# Altium integrated library WR-FPC_rev19a.IntLib: 242 symbols (part 2 of 2)
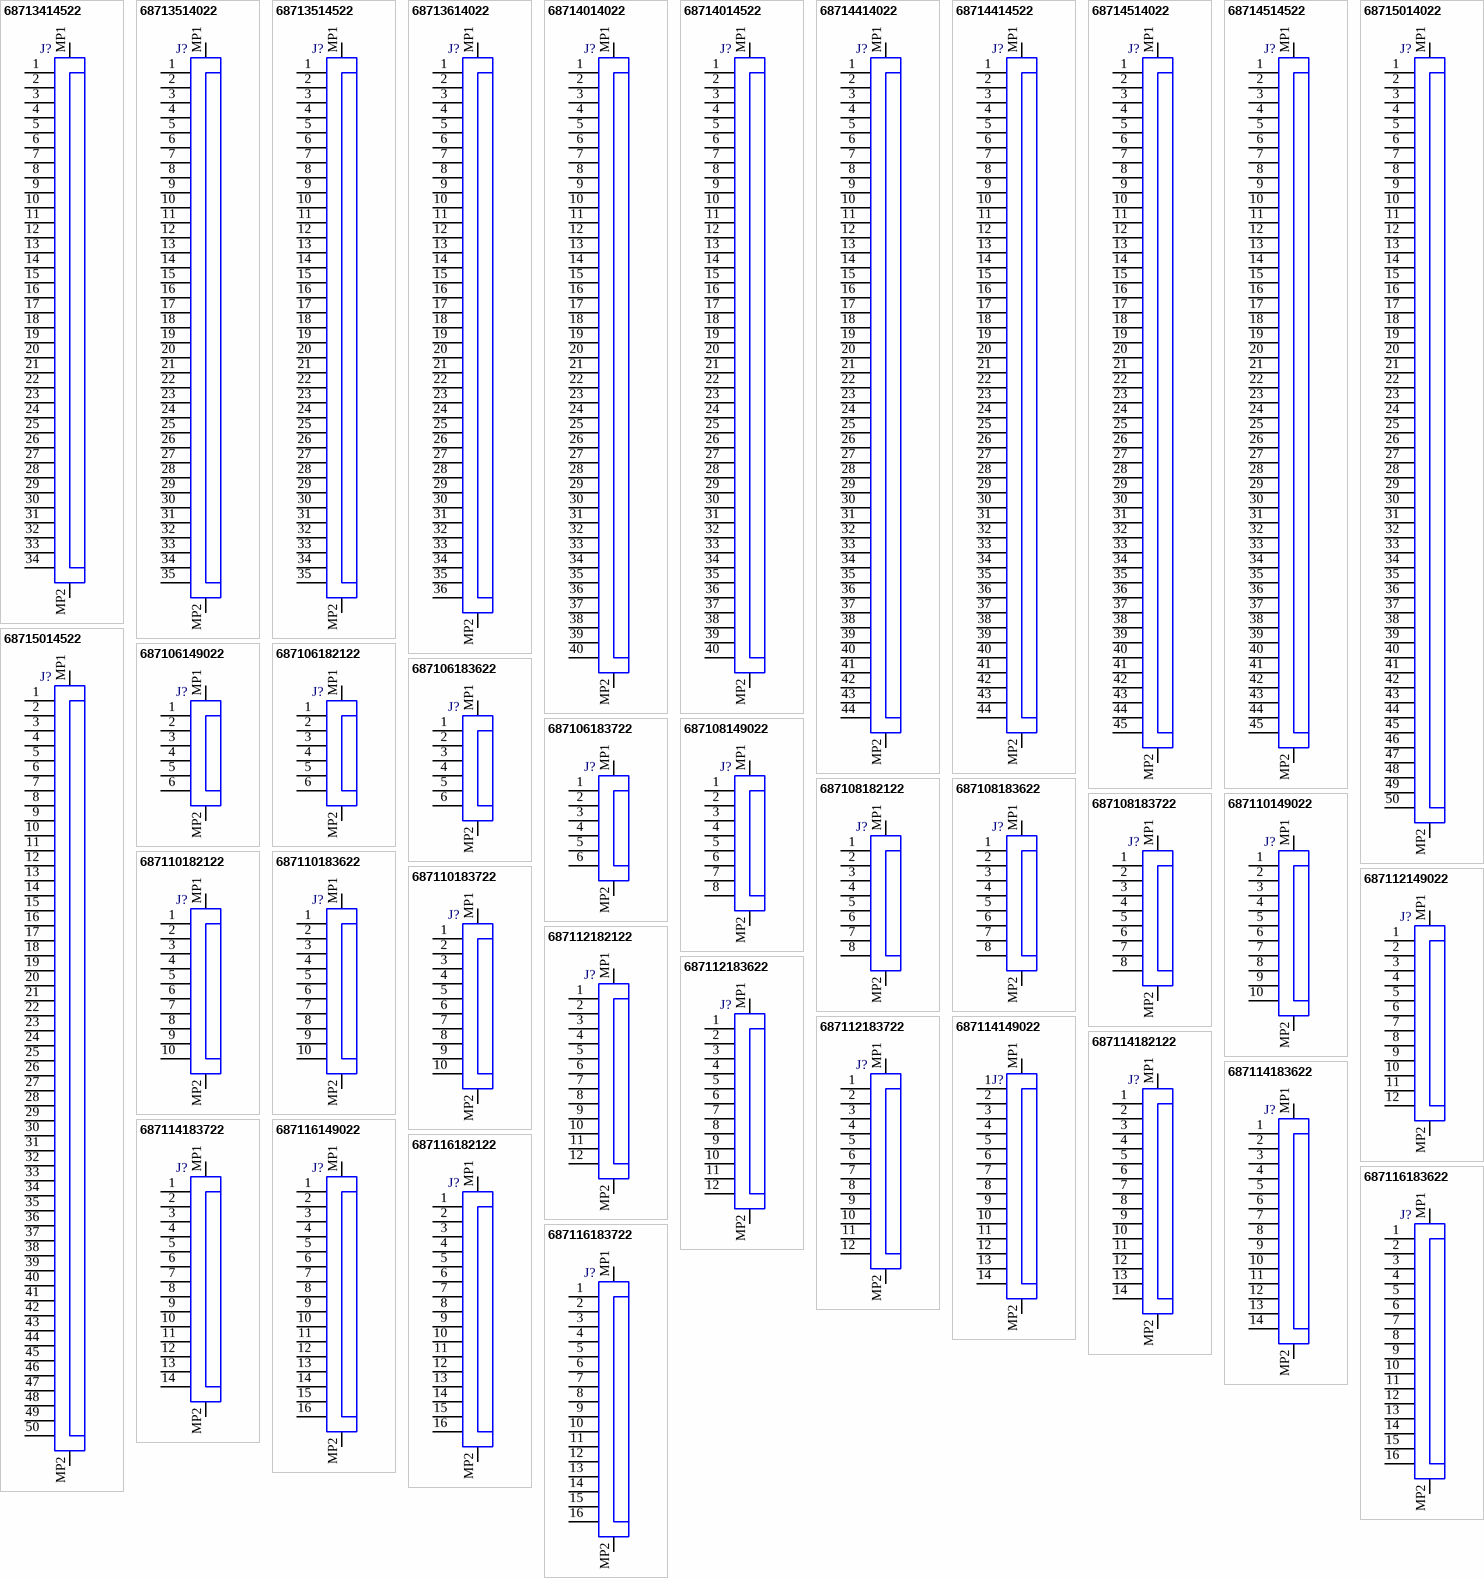
[diagram p8: symbols 68713414522 to 687116183722]

## 687112183622
designator J?
WR-FPC SMT ZIF Horizontal Top Contact Low Profile, pitch 0.5mm, 12p; Part Number: 687112183622; Contact Resistance: 30mOhm; Pin Number: 12; Working Voltage: 50VAC; Rated Current: 0.4A; ComponentLink1Description: Manufacturer; ComponentLink1URL: http://www.we-online.de; ComponentLink2Description: Datasheet; ComponentLink2URL: https://katalog.we-online.com/em/datasheet/687112183622.pdf; Packaging: Tape and Reel; Pitch: 0.5mm; Published Date: November 2019; Mounting Technology: SMT; Operating Temperature: -25 to +85degC; Length: 11.7mm; Type: Horizontal; Publisher: Wurth Elektronik
footprint 687112183622
pins: 1, 2, 3, 4, 5, 6, 7, 8, 9, 10, 11, 12, MP1, MP2

## 687112183722
designator J?
WR-FPC SMT ZIF Horizontal Bottom Contact Low Profile, pitch 0.5mm, 12p; Part Number: 687112183722; Contact Resistance: 30mOhm; Pin Number: 12; Working Voltage: 50VAC; Rated Current: 0.4A; ComponentLink1Description: Manufacturer; ComponentLink1URL: http://www.we-online.de; ComponentLink2Description: Datasheet; ComponentLink2URL: https://katalog.we-online.com/em/datasheet/687112183722.pdf; Packaging: Tape and Reel; Pitch: 0.5mm; Published Date: November 2019; Mounting Technology: SMT; Operating Temperature: -25 to +85degC; Length: 11.7mm; Type: Horizontal; Publisher: Wurth Elektronik
footprint 687112183722
pins: 1, 2, 3, 4, 5, 6, 7, 8, 9, 10, 11, 12, MP1, MP2

## 687114149022
designator J?
WR-FPC SMT ZIF Horizontal Bottom Contact, pitch 0.5mm, 14p; Part Number: 687114149022; Contact Resistance: 50mOhm; Pin Number: 14; Working Voltage: 50VAC; Rated Current: 0.5A; ComponentLink1Description: Manufacturer; ComponentLink1URL: http://www.we-online.de; ComponentLink2Description: Datasheet; ComponentLink2URL: https://katalog.we-online.com/em/datasheet/687114149022.pdf; Packaging: Tape and Reel; Pitch: 0.5mm; Published Date: November 2019; Mounting Technology: SMT; Operating Temperature: -25 to +85degC; Length: 11.1mm; Type: Horizontal; Publisher: Wurth Elektronik
footprint 687114149022
pins: 1, 2, 3, 4, 5, 6, 7, 8, 9, 10, 11, 12, 13, 14, MP1, MP2

## 687114182122
designator J?
WR-FPC SMT ZIF Horizontal Dual Contact, pitch 0.5mm, 14p; Part Number: 687114182122; Contact Resistance: 30mOhm; Pin Number: 14; Working Voltage: 50VAC; Rated Current: 0.5A; ComponentLink1Description: Manufacturer; ComponentLink1URL: http://www.we-online.de; ComponentLink2Description: Datasheet; ComponentLink2URL: https://katalog.we-online.com/em/datasheet/687114182122.pdf; Packaging: Tape and Reel; Pitch: 0.5mm; Published Date: November 2019; Mounting Technology: SMT; Operating Temperature: -25 to +85degC; Length: 9mm; Type: Horizontal; Publisher: Wurth Elektronik
footprint 687114182122
pins: 1, 2, 3, 4, 5, 6, 7, 8, 9, 10, 11, 12, 13, 14, MP1, MP2

## 687114183622
designator J?
WR-FPC SMT ZIF Horizontal Top Contact Low Profile, pitch 0.5mm, 14p; Part Number: 687114183622; Contact Resistance: 30mOhm; Pin Number: 14; Working Voltage: 50VAC; Rated Current: 0.4A; ComponentLink1Description: Manufacturer; ComponentLink1URL: http://www.we-online.de; ComponentLink2Description: Datasheet; ComponentLink2URL: https://katalog.we-online.com/em/datasheet/687114183622.pdf; Packaging: Tape and Reel; Pitch: 0.5mm; Published Date: November 2019; Mounting Technology: SMT; Operating Temperature: -25 to +85degC; Length: 12.7mm; Type: Horizontal; Publisher: Wurth Elektronik
footprint 687114183622
pins: 1, 2, 3, 4, 5, 6, 7, 8, 9, 10, 11, 12, 13, 14, MP1, MP2

## 687114183722
designator J?
WR-FPC SMT ZIF Horizontal Bottom Contact Low Profile, pitch 0.5mm, 14p; Part Number: 687114183722; Contact Resistance: 30mOhm; Pin Number: 14; Working Voltage: 50VAC; Rated Current: 0.4A; ComponentLink1Description: Manufacturer; ComponentLink1URL: http://www.we-online.de; ComponentLink2Description: Datasheet; ComponentLink2URL: https://katalog.we-online.com/em/datasheet/687114183722.pdf; Packaging: Tape and Reel; Pitch: 0.5mm; Published Date: November 2019; Mounting Technology: SMT; Operating Temperature: -25 to +85degC; Length: 12.7mm; Type: Horizontal; Publisher: Wurth Elektronik
footprint 687114183722
pins: 1, 2, 3, 4, 5, 6, 7, 8, 9, 10, 11, 12, 13, 14, MP1, MP2

## 687116149022
designator J?
WR-FPC SMT ZIF Horizontal Bottom Contact, pitch 0.5mm, 16p; Part Number: 687116149022; Contact Resistance: 50mOhm; Pin Number: 16; Working Voltage: 50VAC; Rated Current: 0.5A; ComponentLink1Description: Manufacturer; ComponentLink1URL: http://www.we-online.de; ComponentLink2Description: Datasheet; ComponentLink2URL: https://katalog.we-online.com/em/datasheet/687116149022.pdf; Packaging: Tape and Reel; Pitch: 0.5mm; Published Date: November 2019; Mounting Technology: SMT; Operating Temperature: -25 to +85degC; Length: 12.1mm; Type: Horizontal; Publisher: Wurth Elektronik
footprint 687116149022
pins: 1, 2, 3, 4, 5, 6, 7, 8, 9, 10, 11, 12, 13, 14, 15, 16, MP1, MP2

## 687116182122
designator J?
WR-FPC SMT ZIF Horizontal Dual Contact, pitch 0.5mm, 16p; Part Number: 687116182122; Contact Resistance: 30mOhm; Pin Number: 16; Working Voltage: 50VAC; Rated Current: 0.5A; ComponentLink1Description: Manufacturer; ComponentLink1URL: http://www.we-online.de; ComponentLink2Description: Datasheet; ComponentLink2URL: https://katalog.we-online.com/em/datasheet/687116182122.pdf; Packaging: Tape and Reel; Pitch: 0.5mm; Published Date: November 2019; Mounting Technology: SMT; Operating Temperature: -25 to +85degC; Length: 10mm; Type: Horizontal; Publisher: Wurth Elektronik
footprint 687116182122
pins: 1, 2, 3, 4, 5, 6, 7, 8, 9, 10, 11, 12, 13, 14, 15, 16, MP1, MP2

## 687116183622
designator J?
WR-FPC SMT ZIF Horizontal Top Contact Low Profile, pitch 0.5mm, 16p; Part Number: 687116183622; Contact Resistance: 30mOhm; Pin Number: 16; Working Voltage: 50VAC; Rated Current: 0.4A; ComponentLink1Description: Manufacturer; ComponentLink1URL: http://www.we-online.de; ComponentLink2Description: Datasheet; ComponentLink2URL: https://katalog.we-online.com/em/datasheet/687116183622.pdf; Packaging: Tape and Reel; Pitch: 0.5mm; Published Date: November 2019; Mounting Technology: SMT; Operating Temperature: -25 to +85degC; Length: 13.7mm; Type: Horizontal; Publisher: Wurth Elektronik
footprint 687116183622
pins: 1, 2, 3, 4, 5, 6, 7, 8, 9, 10, 11, 12, 13, 14, 15, 16, MP1, MP2

## 687116183722
designator J?
WR-FPC SMT ZIF Horizontal Bottom Contact Low Profile, pitch 0.5mm, 16p; Part Number: 687116183722; Contact Resistance: 30mOhm; Pin Number: 16; Working Voltage: 50VAC; Rated Current: 0.4A; ComponentLink1Description: Manufacturer; ComponentLink1URL: http://www.we-online.de; ComponentLink2Description: Datasheet; ComponentLink2URL: https://katalog.we-online.com/em/datasheet/687116183722.pdf; Packaging: Tape and Reel; Pitch: 0.5mm; Published Date: November 2019; Mounting Technology: SMT; Operating Temperature: -25 to +85degC; Length: 13.7mm; Type: Horizontal; Publisher: Wurth Elektronik
footprint 687116183722
pins: 1, 2, 3, 4, 5, 6, 7, 8, 9, 10, 11, 12, 13, 14, 15, 16, MP1, MP2

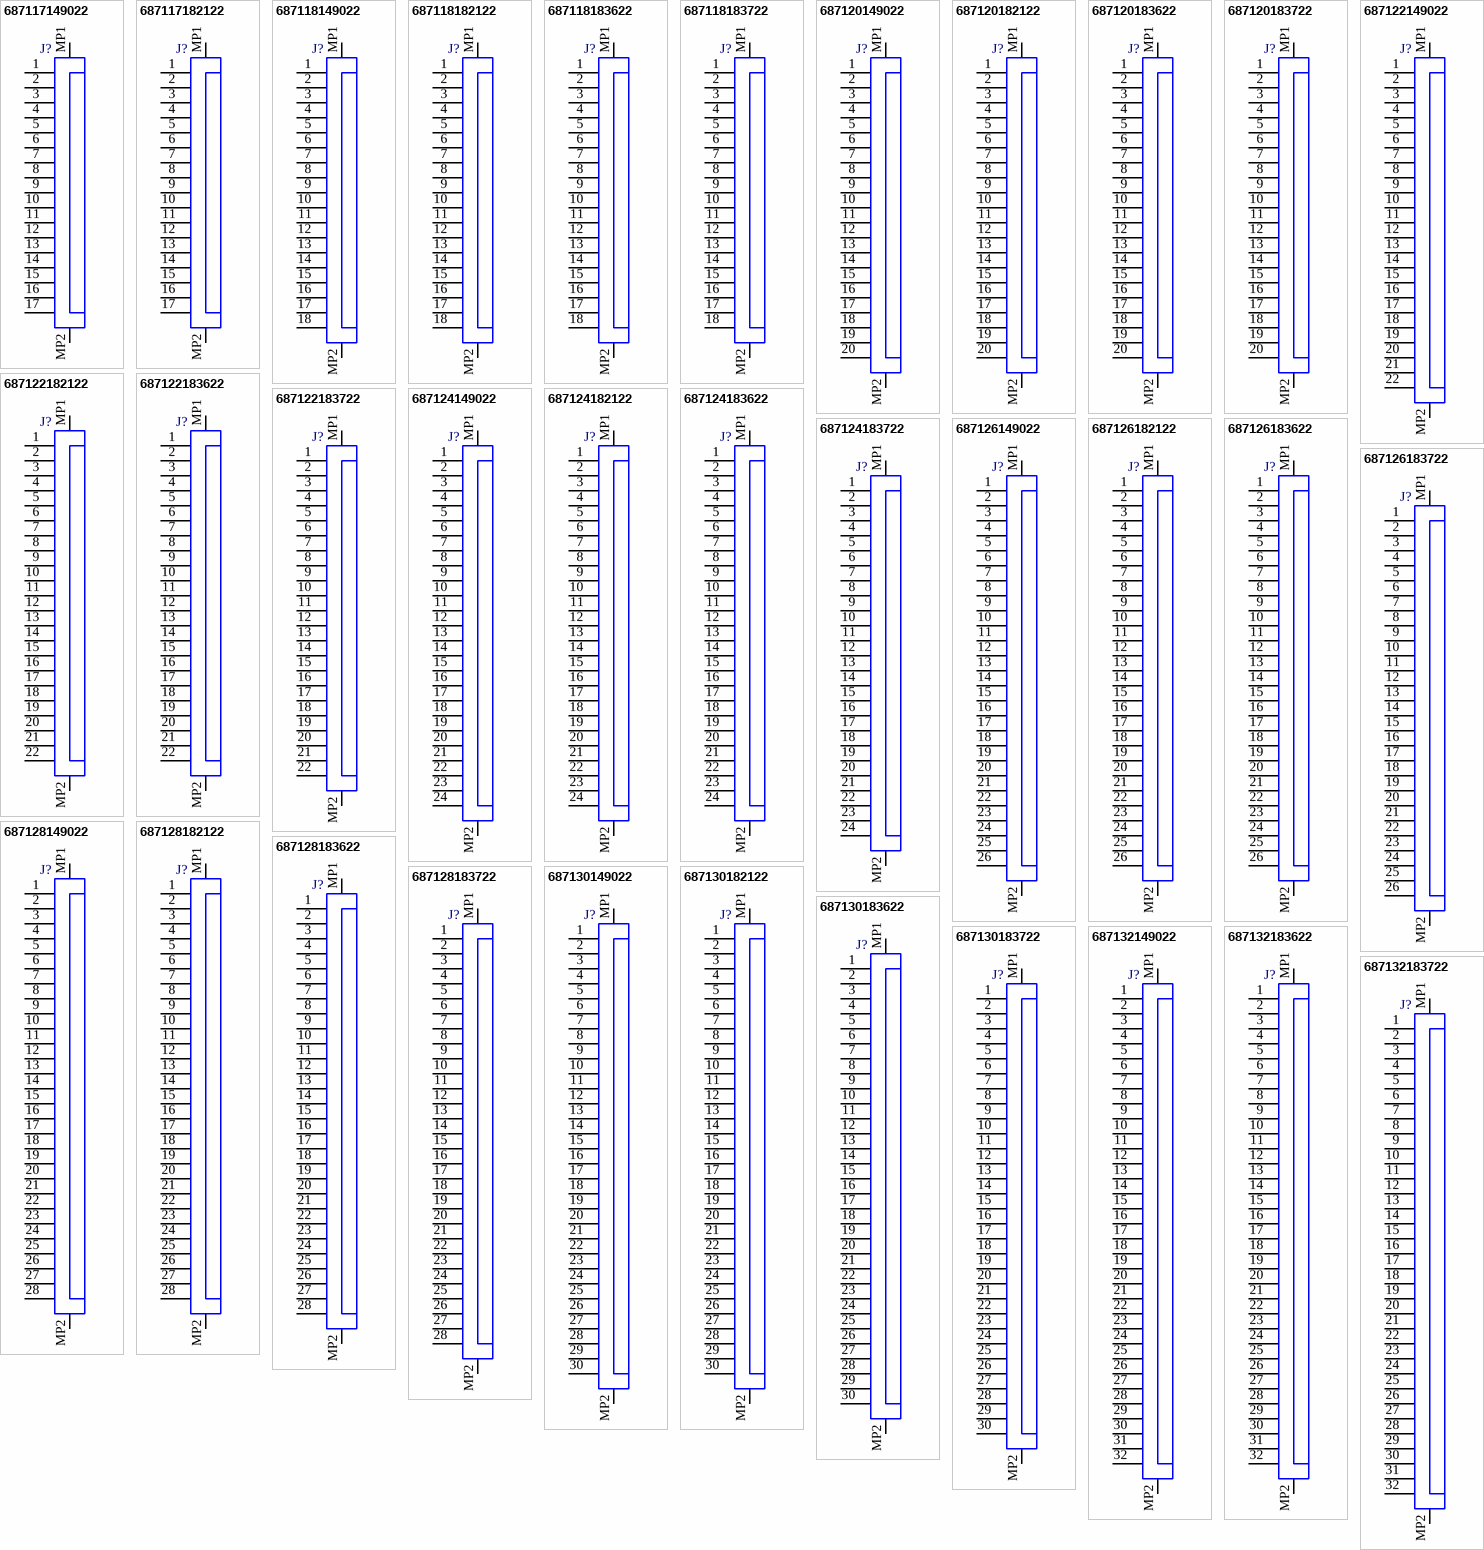
[diagram p5: symbols 687117149022 to 687132183722]

## 687117149022
designator J?
WR-FPC SMT ZIF Horizontal Bottom Contact, pitch 0.5mm, 17p; Part Number: 687117149022; Contact Resistance: 50mOhm; Pin Number: 17; Working Voltage: 50VAC; Rated Current: 0.5A; ComponentLink1Description: Manufacturer; ComponentLink1URL: http://www.we-online.de; ComponentLink2Description: Datasheet; ComponentLink2URL: https://katalog.we-online.com/em/datasheet/687117149022.pdf; Packaging: Tape and Reel; Pitch: 0.5mm; Published Date: November 2019; Mounting Technology: SMT; Operating Temperature: -25 to +85degC; Length: 12.6mm; Type: Horizontal; Publisher: Wurth Elektronik
footprint 687117149022
pins: 1, 2, 3, 4, 5, 6, 7, 8, 9, 10, 11, 12, 13, 14, 15, 16, 17, MP1, MP2

## 687117182122
designator J?
WR-FPC SMT ZIF Horizontal Dual Contact, pitch 0.5mm, 17p; Part Number: 687117182122; Contact Resistance: 30mOhm; Pin Number: 17; Working Voltage: 50VAC; Rated Current: 0.5A; ComponentLink1Description: Manufacturer; ComponentLink1URL: http://www.we-online.de; ComponentLink2Description: Datasheet; ComponentLink2URL: https://katalog.we-online.com/em/datasheet/687117182122.pdf; Packaging: Tape and Reel; Pitch: 0.5mm; Published Date: November 2019; Mounting Technology: SMT; Operating Temperature: -25 to +85degC; Length: 10.5mm; Type: Horizontal; Publisher: Wurth Elektronik
footprint 687117182122
pins: 1, 2, 3, 4, 5, 6, 7, 8, 9, 10, 11, 12, 13, 14, 15, 16, 17, MP1, MP2

## 687118149022
designator J?
WR-FPC SMT ZIF Horizontal Bottom Contact, pitch 0.5mm, 18p; Part Number: 687118149022; Contact Resistance: 50mOhm; Pin Number: 18; Working Voltage: 50VAC; Rated Current: 0.5A; ComponentLink1Description: Manufacturer; ComponentLink1URL: http://www.we-online.de; ComponentLink2Description: Datasheet; ComponentLink2URL: https://katalog.we-online.com/em/datasheet/687118149022.pdf; Packaging: Tape and Reel; Pitch: 0.5mm; Published Date: November 2019; Mounting Technology: SMT; Operating Temperature: -25 to +85degC; Length: 13.1mm; Type: Horizontal; Publisher: Wurth Elektronik
footprint 687118149022
pins: 1, 2, 3, 4, 5, 6, 7, 8, 9, 10, 11, 12, 13, 14, 15, 16, 17, 18, MP1, MP2

## 687118182122
designator J?
WR-FPC SMT ZIF Horizontal Dual Contact, pitch 0.5mm, 18p; Part Number: 687118182122; Contact Resistance: 30mOhm; Pin Number: 18; Working Voltage: 50VAC; Rated Current: 0.5A; ComponentLink1Description: Manufacturer; ComponentLink1URL: http://www.we-online.de; ComponentLink2Description: Datasheet; ComponentLink2URL: https://katalog.we-online.com/em/datasheet/687118182122.pdf; Packaging: Tape and Reel; Pitch: 0.5mm; Published Date: November 2019; Mounting Technology: SMT; Operating Temperature: -25 to +85degC; Length: 11mm; Type: Horizontal; Publisher: Wurth Elektronik
footprint 687118182122
pins: 1, 2, 3, 4, 5, 6, 7, 8, 9, 10, 11, 12, 13, 14, 15, 16, 17, 18, MP1, MP2

## 687118183622
designator J?
WR-FPC SMT ZIF Horizontal Top Contact Low Profile, pitch 0.5mm, 18p; Part Number: 687118183622; Contact Resistance: 30mOhm; Pin Number: 18; Working Voltage: 50VAC; Rated Current: 0.4A; ComponentLink1Description: Manufacturer; ComponentLink1URL: http://www.we-online.de; ComponentLink2Description: Datasheet; ComponentLink2URL: https://katalog.we-online.com/em/datasheet/687118183622.pdf; Packaging: Tape and Reel; Pitch: 0.5mm; Published Date: November 2019; Mounting Technology: SMT; Operating Temperature: -25 to +85degC; Length: 14.7mm; Type: Horizontal; Publisher: Wurth Elektronik
footprint 687118183622
pins: 1, 2, 3, 4, 5, 6, 7, 8, 9, 10, 11, 12, 13, 14, 15, 16, 17, 18, MP1, MP2

## 687118183722
designator J?
WR-FPC SMT ZIF Horizontal Bottom Contact Low Profile, pitch 0.5mm, 18p; Part Number: 687118183722; Contact Resistance: 30mOhm; Pin Number: 18; Working Voltage: 50VAC; Rated Current: 0.4A; ComponentLink1Description: Manufacturer; ComponentLink1URL: http://www.we-online.de; ComponentLink2Description: Datasheet; ComponentLink2URL: https://katalog.we-online.com/em/datasheet/687118183722.pdf; Packaging: Tape and Reel; Pitch: 0.5mm; Published Date: November 2019; Mounting Technology: SMT; Operating Temperature: -25 to +85degC; Length: 14.7mm; Type: Horizontal; Publisher: Wurth Elektronik
footprint 687118183722
pins: 1, 2, 3, 4, 5, 6, 7, 8, 9, 10, 11, 12, 13, 14, 15, 16, 17, 18, MP1, MP2

## 687120149022
designator J?
WR-FPC SMT ZIF Horizontal Bottom Contact, pitch 0.5mm, 20p; Part Number: 687120149022; Contact Resistance: 50mOhm; Pin Number: 20; Working Voltage: 50VAC; Rated Current: 0.5A; ComponentLink1Description: Manufacturer; ComponentLink1URL: http://www.we-online.de; ComponentLink2Description: Datasheet; ComponentLink2URL: https://katalog.we-online.com/em/datasheet/687120149022.pdf; Packaging: Tape and Reel; Pitch: 0.5mm; Published Date: November 2019; Mounting Technology: SMT; Operating Temperature: -25 to +85degC; Length: 14.1mm; Type: Horizontal; Publisher: Wurth Elektronik
footprint 687120149022
pins: 1, 2, 3, 4, 5, 6, 7, 8, 9, 10, 11, 12, 13, 14, 15, 16, 17, 18, 19, 20, MP1, MP2

## 687120182122
designator J?
WR-FPC SMT ZIF Horizontal Dual Contact, pitch 0.5mm, 20p; Part Number: 687120182122; Contact Resistance: 30mOhm; Pin Number: 20; Working Voltage: 50VAC; Rated Current: 0.5A; ComponentLink1Description: Manufacturer; ComponentLink1URL: http://www.we-online.de; ComponentLink2Description: Datasheet; ComponentLink2URL: https://katalog.we-online.com/em/datasheet/687120182122.pdf; Packaging: Tape and Reel; Pitch: 0.5mm; Published Date: November 2019; Mounting Technology: SMT; Operating Temperature: -25 to +85degC; Length: 12mm; Type: Horizontal; Publisher: Wurth Elektronik
footprint 687120182122
pins: 1, 2, 3, 4, 5, 6, 7, 8, 9, 10, 11, 12, 13, 14, 15, 16, 17, 18, 19, 20, MP1, MP2

## 687120183622
designator J?
WR-FPC SMT ZIF Horizontal Top Contact Low Profile, pitch 0.5mm, 20p; Part Number: 687120183622; Contact Resistance: 30mOhm; Pin Number: 20; Working Voltage: 50VAC; Rated Current: 0.4A; ComponentLink1Description: Manufacturer; ComponentLink1URL: http://www.we-online.de; ComponentLink2Description: Datasheet; ComponentLink2URL: https://katalog.we-online.com/em/datasheet/687120183622.pdf; Packaging: Tape and Reel; Pitch: 0.5mm; Published Date: November 2019; Mounting Technology: SMT; Operating Temperature: -25 to +85degC; Length: 15.7mm; Type: Horizontal; Publisher: Wurth Elektronik
footprint 687120183622
pins: 1, 2, 3, 4, 5, 6, 7, 8, 9, 10, 11, 12, 13, 14, 15, 16, 17, 18, 19, 20, MP1, MP2

## 687120183722
designator J?
WR-FPC SMT ZIF Horizontal Bottom Contact Low Profile, pitch 0.5mm, 20p; Part Number: 687120183722; Contact Resistance: 30mOhm; Pin Number: 20; Working Voltage: 50VAC; Rated Current: 0.4A; ComponentLink1Description: Manufacturer; ComponentLink1URL: http://www.we-online.de; ComponentLink2Description: Datasheet; ComponentLink2URL: https://katalog.we-online.com/em/datasheet/687120183722.pdf; Packaging: Tape and Reel; Pitch: 0.5mm; Published Date: November 2019; Mounting Technology: SMT; Operating Temperature: -25 to +85degC; Length: 15.7mm; Type: Horizontal; Publisher: Wurth Elektronik
footprint 687120183722
pins: 1, 2, 3, 4, 5, 6, 7, 8, 9, 10, 11, 12, 13, 14, 15, 16, 17, 18, 19, 20, MP1, MP2

## 687122149022
designator J?
WR-FPC SMT ZIF Horizontal Bottom Contact, pitch 0.5mm, 22p; Part Number: 687122149022; Contact Resistance: 50mOhm; Pin Number: 22; Working Voltage: 50VAC; Rated Current: 0.5A; ComponentLink1Description: Manufacturer; ComponentLink1URL: http://www.we-online.de; ComponentLink2Description: Datasheet; ComponentLink2URL: https://katalog.we-online.com/em/datasheet/687122149022.pdf; Packaging: Tape and Reel; Pitch: 0.5mm; Published Date: November 2019; Mounting Technology: SMT; Operating Temperature: -25 to +85degC; Length: 15.1mm; Type: Horizontal; Publisher: Wurth Elektronik
footprint 687122149022
pins: 1, 2, 3, 4, 5, 6, 7, 8, 9, 10, 11, 12, 13, 14, 15, 16, 17, 18, 19, 20, 21, 22, MP1, MP2

## 687122182122
designator J?
WR-FPC SMT ZIF Horizontal Dual Contact, pitch 0.5mm, 22p; Part Number: 687122182122; Contact Resistance: 30mOhm; Pin Number: 22; Working Voltage: 50VAC; Rated Current: 0.5A; ComponentLink1Description: Manufacturer; ComponentLink1URL: http://www.we-online.de; ComponentLink2Description: Datasheet; ComponentLink2URL: https://katalog.we-online.com/em/datasheet/687122182122.pdf; Packaging: Tape and Reel; Pitch: 0.5mm; Published Date: November 2019; Mounting Technology: SMT; Operating Temperature: -25 to +85degC; Length: 13mm; Type: Horizontal; Publisher: Wurth Elektronik
footprint 687122182122
pins: 1, 2, 3, 4, 5, 6, 7, 8, 9, 10, 11, 12, 13, 14, 15, 16, 17, 18, 19, 20, 21, 22, MP1, MP2

## 687122183622
designator J?
WR-FPC SMT ZIF Horizontal Top Contact Low Profile, pitch 0.5mm, 22p; Part Number: 687122183622; Contact Resistance: 30mOhm; Pin Number: 22; Working Voltage: 50VAC; Rated Current: 0.4A; ComponentLink1Description: Manufacturer; ComponentLink1URL: http://www.we-online.de; ComponentLink2Description: Datasheet; ComponentLink2URL: https://katalog.we-online.com/em/datasheet/687122183622.pdf; Packaging: Tape and Reel; Pitch: 0.5mm; Published Date: November 2019; Mounting Technology: SMT; Operating Temperature: -25 to +85degC; Length: 16.7mm; Type: Horizontal; Publisher: Wurth Elektronik
footprint 687122183622
pins: 1, 2, 3, 4, 5, 6, 7, 8, 9, 10, 11, 12, 13, 14, 15, 16, 17, 18, 19, 20, 21, 22, MP1, MP2

## 687122183722
designator J?
WR-FPC SMT ZIF Horizontal Bottom Contact Low Profile, pitch 0.5mm, 22p; Part Number: 687122183722; Contact Resistance: 30mOhm; Pin Number: 22; Working Voltage: 50VAC; Rated Current: 0.4A; ComponentLink1Description: Manufacturer; ComponentLink1URL: http://www.we-online.de; ComponentLink2Description: Datasheet; ComponentLink2URL: https://katalog.we-online.com/em/datasheet/687122183722.pdf; Packaging: Tape and Reel; Pitch: 0.5mm; Published Date: November 2019; Mounting Technology: SMT; Operating Temperature: -25 to +85degC; Length: 16.7mm; Type: Horizontal; Publisher: Wurth Elektronik
footprint 687122183722
pins: 1, 2, 3, 4, 5, 6, 7, 8, 9, 10, 11, 12, 13, 14, 15, 16, 17, 18, 19, 20, 21, 22, MP1, MP2

## 687124149022
designator J?
WR-FPC SMT ZIF Horizontal Bottom Contact, pitch 0.5mm, 24p; Part Number: 687124149022; Contact Resistance: 50mOhm; Pin Number: 24; Working Voltage: 50VAC; Rated Current: 0.5A; ComponentLink1Description: Manufacturer; ComponentLink1URL: http://www.we-online.de; ComponentLink2Description: Datasheet; ComponentLink2URL: https://katalog.we-online.com/em/datasheet/687124149022.pdf; Packaging: Tape and Reel; Pitch: 0.5mm; Published Date: November 2019; Mounting Technology: SMT; Operating Temperature: -25 to +85degC; Length: 16.1mm; Type: Horizontal; Publisher: Wurth Elektronik
footprint 687124149022
pins: 1, 2, 3, 4, 5, 6, 7, 8, 9, 10, 11, 12, 13, 14, 15, 16, 17, 18, 19, 20, 21, 22, 23, 24, MP1, MP2

## 687124182122
designator J?
WR-FPC SMT ZIF Horizontal Dual Contact, pitch 0.5mm, 24p; Part Number: 687124182122; Contact Resistance: 30mOhm; Pin Number: 24; Working Voltage: 50VAC; Rated Current: 0.5A; ComponentLink1Description: Manufacturer; ComponentLink1URL: http://www.we-online.de; ComponentLink2Description: Datasheet; ComponentLink2URL: https://katalog.we-online.com/em/datasheet/687124182122.pdf; Packaging: Tape and Reel; Pitch: 0.5mm; Published Date: November 2019; Mounting Technology: SMT; Operating Temperature: -25 to +85degC; Length: 14mm; Type: Horizontal; Publisher: Wurth Elektronik
footprint 687124182122
pins: 1, 2, 3, 4, 5, 6, 7, 8, 9, 10, 11, 12, 13, 14, 15, 16, 17, 18, 19, 20, 21, 22, 23, 24, MP1, MP2

## 687124183622
designator J?
WR-FPC SMT ZIF Horizontal Top Contact Low Profile, pitch 0.5mm, 24p; Part Number: 687124183622; Contact Resistance: 30mOhm; Pin Number: 24; Working Voltage: 50VAC; Rated Current: 0.4A; ComponentLink1Description: Manufacturer; ComponentLink1URL: http://www.we-online.de; ComponentLink2Description: Datasheet; ComponentLink2URL: https://katalog.we-online.com/em/datasheet/687124183622.pdf; Packaging: Tape and Reel; Pitch: 0.5mm; Published Date: November 2019; Mounting Technology: SMT; Operating Temperature: -25 to +85degC; Length: 17.7mm; Type: Horizontal; Publisher: Wurth Elektronik
footprint 687124183622
pins: 1, 2, 3, 4, 5, 6, 7, 8, 9, 10, 11, 12, 13, 14, 15, 16, 17, 18, 19, 20, 21, 22, 23, 24, MP1, MP2

## 687124183722
designator J?
WR-FPC SMT ZIF Horizontal Bottom Contact Low Profile, pitch 0.5mm, 24p; Part Number: 687124183722; Contact Resistance: 30mOhm; Pin Number: 24; Working Voltage: 50VAC; Rated Current: 0.4A; ComponentLink1Description: Manufacturer; ComponentLink1URL: http://www.we-online.de; ComponentLink2Description: Datasheet; ComponentLink2URL: https://katalog.we-online.com/em/datasheet/687124183722.pdf; Packaging: Tape and Reel; Pitch: 0.5mm; Published Date: November 2019; Mounting Technology: SMT; Operating Temperature: -25 to +85degC; Length: 17.7mm; Type: Horizontal; Publisher: Wurth Elektronik
footprint 687124183722
pins: 1, 2, 3, 4, 5, 6, 7, 8, 9, 10, 11, 12, 13, 14, 15, 16, 17, 18, 19, 20, 21, 22, 23, 24, MP1, MP2

## 687126149022
designator J?
WR-FPC SMT ZIF Horizontal Bottom Contact, pitch 0.5mm, 26p; Part Number: 687126149022; Contact Resistance: 50mOhm; Pin Number: 26; Working Voltage: 50VAC; Rated Current: 0.5A; ComponentLink1Description: Manufacturer; ComponentLink1URL: http://www.we-online.de; ComponentLink2Description: Datasheet; ComponentLink2URL: https://katalog.we-online.com/em/datasheet/687126149022.pdf; Packaging: Tape and Reel; Pitch: 0.5mm; Published Date: November 2019; Mounting Technology: SMT; Operating Temperature: -25 to +85degC; Length: 17.1mm; Type: Horizontal; Publisher: Wurth Elektronik
footprint 687126149022
pins: 1, 2, 3, 4, 5, 6, 7, 8, 9, 10, 11, 12, 13, 14, 15, 16, 17, 18, 19, 20, 21, 22, 23, 24, 25, 26, MP1, MP2

## 687126182122
designator J?
WR-FPC SMT ZIF Horizontal Dual Contact, pitch 0.5mm, 26p; Part Number: 687126182122; Contact Resistance: 30mOhm; Pin Number: 26; Working Voltage: 50VAC; Rated Current: 0.5A; ComponentLink1Description: Manufacturer; ComponentLink1URL: http://www.we-online.de; ComponentLink2Description: Datasheet; ComponentLink2URL: https://katalog.we-online.com/em/datasheet/687126182122.pdf; Packaging: Tape and Reel; Pitch: 0.5mm; Published Date: November 2019; Mounting Technology: SMT; Operating Temperature: -25 to +85degC; Length: 15mm; Type: Horizontal; Publisher: Wurth Elektronik
footprint 687126182122
pins: 1, 2, 3, 4, 5, 6, 7, 8, 9, 10, 11, 12, 13, 14, 15, 16, 17, 18, 19, 20, 21, 22, 23, 24, 25, 26, MP1, MP2

## 687126183622
designator J?
WR-FPC SMT ZIF Horizontal Top Contact Low Profile, pitch 0.5mm, 26p; Part Number: 687126183622; Contact Resistance: 30mOhm; Pin Number: 26; Working Voltage: 50VAC; Rated Current: 0.4A; ComponentLink1Description: Manufacturer; ComponentLink1URL: http://www.we-online.de; ComponentLink2Description: Datasheet; ComponentLink2URL: https://katalog.we-online.com/em/datasheet/687126183622.pdf; Packaging: Tape and Reel; Pitch: 0.5mm; Published Date: November 2019; Mounting Technology: SMT; Operating Temperature: -25 to +85degC; Length: 18.7mm; Type: Horizontal; Publisher: Wurth Elektronik
footprint 687126183622
pins: 1, 2, 3, 4, 5, 6, 7, 8, 9, 10, 11, 12, 13, 14, 15, 16, 17, 18, 19, 20, 21, 22, 23, 24, 25, 26, MP1, MP2

## 687126183722
designator J?
WR-FPC SMT ZIF Horizontal Bottom Contact Low Profile, pitch 0.5mm, 26p; Part Number: 687126183722; Contact Resistance: 30mOhm; Pin Number: 26; Working Voltage: 50VAC; Rated Current: 0.4A; ComponentLink1Description: Manufacturer; ComponentLink1URL: http://www.we-online.de; ComponentLink2Description: Datasheet; ComponentLink2URL: https://katalog.we-online.com/em/datasheet/687126183722.pdf; Packaging: Tape and Reel; Pitch: 0.5mm; Published Date: November 2019; Mounting Technology: SMT; Operating Temperature: -25 to +85degC; Length: 18.7mm; Type: Horizontal; Publisher: Wurth Elektronik
footprint 687126183722
pins: 1, 2, 3, 4, 5, 6, 7, 8, 9, 10, 11, 12, 13, 14, 15, 16, 17, 18, 19, 20, 21, 22, 23, 24, 25, 26, MP1, MP2

## 687128149022
designator J?
WR-FPC SMT ZIF Horizontal Bottom Contact, pitch 0.5mm, 28p; Part Number: 687128149022; Contact Resistance: 50mOhm; Pin Number: 28; Working Voltage: 50VAC; Rated Current: 0.5A; ComponentLink1Description: Manufacturer; ComponentLink1URL: http://www.we-online.de; ComponentLink2Description: Datasheet; ComponentLink2URL: https://katalog.we-online.com/em/datasheet/687128149022.pdf; Packaging: Tape and Reel; Pitch: 0.5mm; Published Date: November 2019; Mounting Technology: SMT; Operating Temperature: -25 to +85degC; Length: 18.1mm; Type: Horizontal; Publisher: Wurth Elektronik
footprint 687128149022
pins: 1, 2, 3, 4, 5, 6, 7, 8, 9, 10, 11, 12, 13, 14, 15, 16, 17, 18, 19, 20, 21, 22, 23, 24, 25, 26, 27, 28, MP1, MP2

## 687128182122
designator J?
WR-FPC SMT ZIF Horizontal Dual Contact, pitch 0.5mm, 28p; Part Number: 687128182122; Contact Resistance: 30mOhm; Pin Number: 28; Working Voltage: 50VAC; Rated Current: 0.5A; ComponentLink1Description: Manufacturer; ComponentLink1URL: http://www.we-online.de; ComponentLink2Description: Datasheet; ComponentLink2URL: https://katalog.we-online.com/em/datasheet/687128182122.pdf; Packaging: Tape and Reel; Pitch: 0.5mm; Published Date: November 2019; Mounting Technology: SMT; Operating Temperature: -25 to +85degC; Length: 16mm; Type: Horizontal; Publisher: Wurth Elektronik
footprint 687128182122
pins: 1, 2, 3, 4, 5, 6, 7, 8, 9, 10, 11, 12, 13, 14, 15, 16, 17, 18, 19, 20, 21, 22, 23, 24, 25, 26, 27, 28, MP1, MP2

## 687128183622
designator J?
WR-FPC SMT ZIF Horizontal Top Contact Low Profile, pitch 0.5mm, 28p; Part Number: 687128183622; Contact Resistance: 30mOhm; Pin Number: 28; Working Voltage: 50VAC; Rated Current: 0.4A; ComponentLink1Description: Manufacturer; ComponentLink1URL: http://www.we-online.de; ComponentLink2Description: Datasheet; ComponentLink2URL: https://katalog.we-online.com/em/datasheet/687128183622.pdf; Packaging: Tape and Reel; Pitch: 0.5mm; Published Date: November 2019; Mounting Technology: SMT; Operating Temperature: -25 to +85degC; Length: 19.7mm; Type: Horizontal; Publisher: Wurth Elektronik
footprint 687128183622
pins: 1, 2, 3, 4, 5, 6, 7, 8, 9, 10, 11, 12, 13, 14, 15, 16, 17, 18, 19, 20, 21, 22, 23, 24, 25, 26, 27, 28, MP1, MP2

## 687128183722
designator J?
WR-FPC SMT ZIF Horizontal Bottom Contact Low Profile, pitch 0.5mm, 28p; Part Number: 687128183722; Contact Resistance: 30mOhm; Pin Number: 28; Working Voltage: 50VAC; Rated Current: 0.4A; ComponentLink1Description: Manufacturer; ComponentLink1URL: http://www.we-online.de; ComponentLink2Description: Datasheet; ComponentLink2URL: https://katalog.we-online.com/em/datasheet/687128183722.pdf; Packaging: Tape and Reel; Pitch: 0.5mm; Published Date: November 2019; Mounting Technology: SMT; Operating Temperature: -25 to +85degC; Length: 19.7mm; Type: Horizontal; Publisher: Wurth Elektronik
footprint 687128183722
pins: 1, 2, 3, 4, 5, 6, 7, 8, 9, 10, 11, 12, 13, 14, 15, 16, 17, 18, 19, 20, 21, 22, 23, 24, 25, 26, 27, 28, MP1, MP2

## 687130149022
designator J?
WR-FPC SMT ZIF Horizontal Bottom Contact, pitch 0.5mm, 30p; Part Number: 687130149022; Contact Resistance: 50mOhm; Pin Number: 30; Working Voltage: 50VAC; Rated Current: 0.5A; ComponentLink1Description: Manufacturer; ComponentLink1URL: http://www.we-online.de; ComponentLink2Description: Datasheet; ComponentLink2URL: https://katalog.we-online.com/em/datasheet/687130149022.pdf; Packaging: Tape and Reel; Pitch: 0.5mm; Published Date: November 2019; Mounting Technology: SMT; Operating Temperature: -25 to +85degC; Length: 19.1mm; Type: Horizontal; Publisher: Wurth Elektronik
footprint 687130149022
pins: 1, 2, 3, 4, 5, 6, 7, 8, 9, 10, 11, 12, 13, 14, 15, 16, 17, 18, 19, 20, 21, 22, 23, 24, 25, 26, 27, 28, 29, 30, MP1, MP2
